# Altium footprint library Basal.PcbLib: 248 footprints (part 5 of 16)
Each footprint in its own frame and in the unit in brackets; x right, y up, seen from the top. Pads: shape width x height; smd on the part's side, far side on the other; paste and mask are expansions set on the pad; w line width, h text height; cw(c..) or ccw(c..) is an arc to the next point about the centre after c.
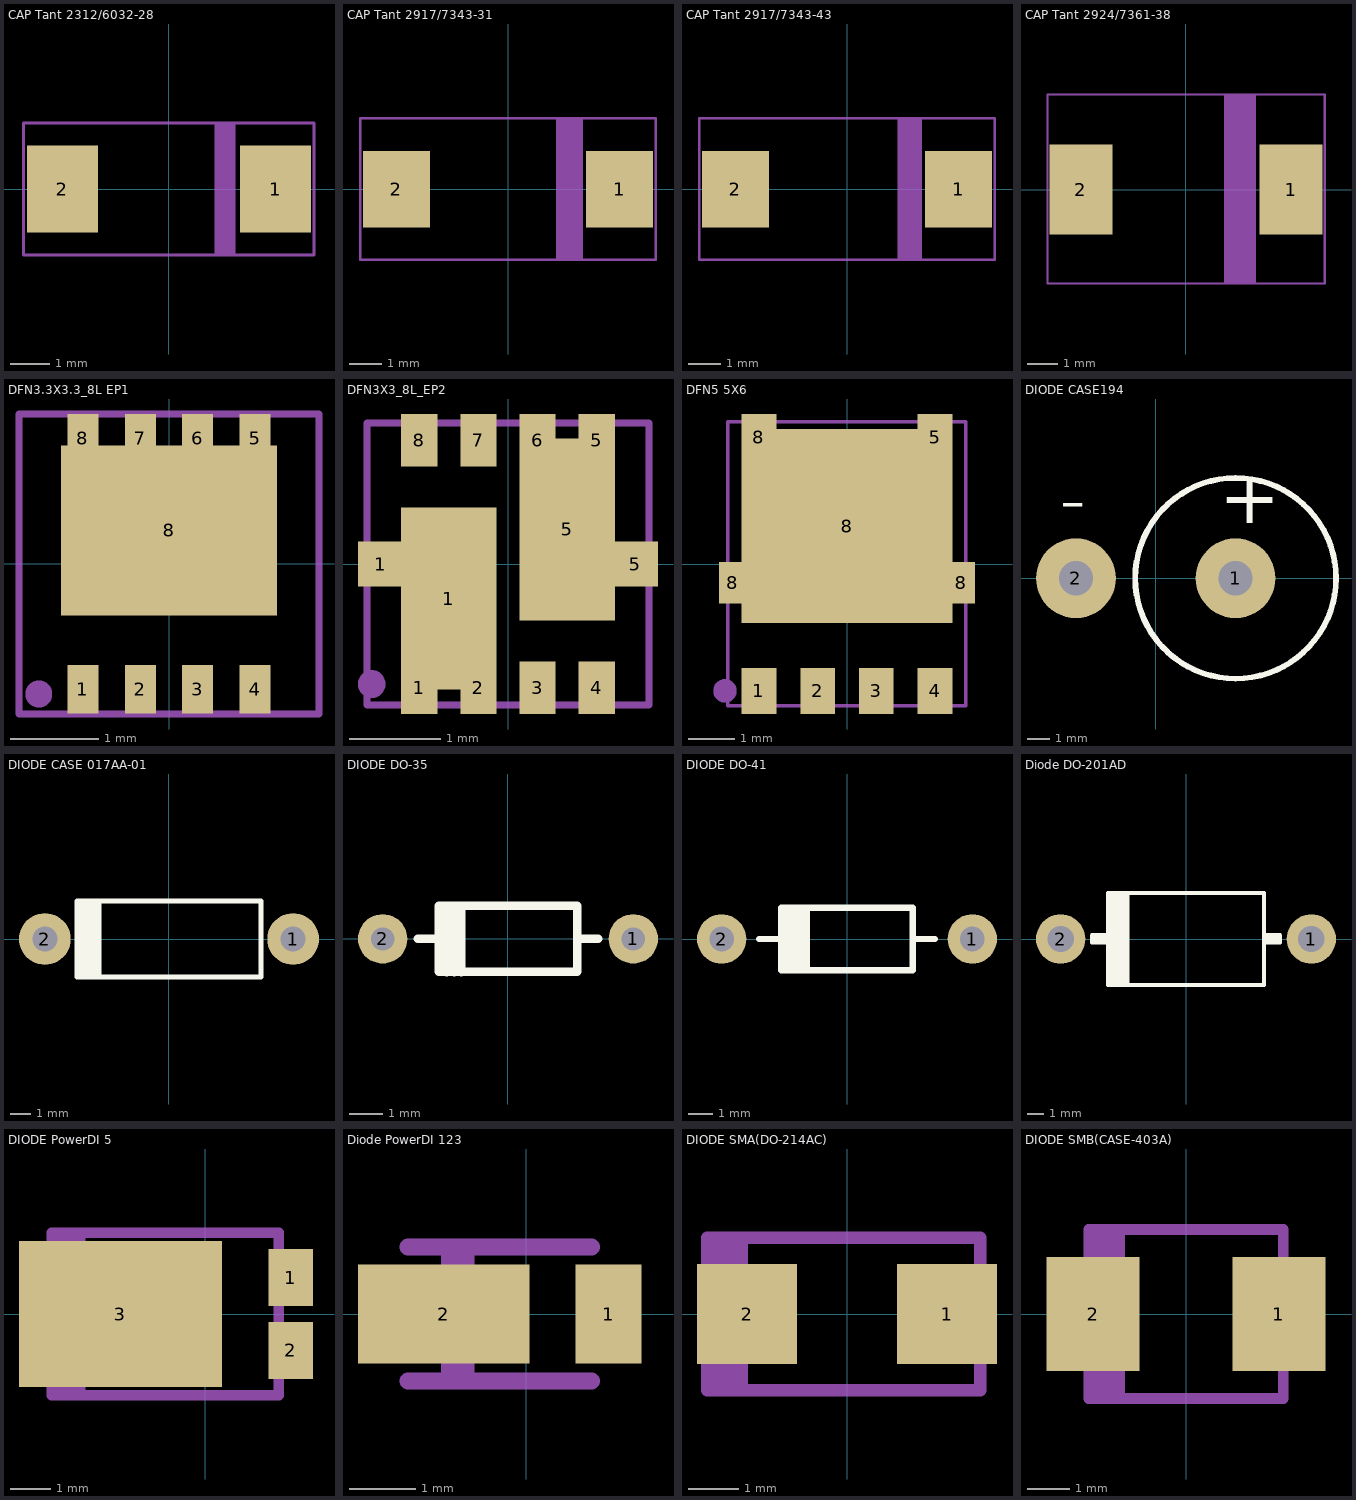
[diagram p4: the footprints below, top view; thin cyan lines are the x and y axes]

## CAP Tant 2312/6032-28 [mm] "钽电容C型封装"
height 28
pads (2):
  rect 1.8x2.2 smd: 1(2.7,0) 2(-2.7,0)
Mechanical 15:
  lines w0.076: 1.194,-1.672 1.194,1.68 ; 1.27,-1.672 1.27,1.68 ; 1.346,-1.672 1.346,1.68 ; 1.422,-1.672 1.422,1.68 ; 1.499,-1.672 1.499,1.68 ; 1.575,-1.672 1.575,1.68 ; 1.651,-1.672 1.651,1.68 ; -3.687,-1.672 -3.687,1.68 3.679,1.68 3.679,-1.672 -3.687,-1.672
3D body "AVX_C_CASE.STEP": height 2.7, standoff 0, extent -3.054,-1.671 3.046,1.679

## CAP Tant 2917/7343-31 [mm] "钽电容D型封装"
height 31
pads (2):
  rect 2.1x2.4 smd: 1(3.5,0) 2(-3.5,0)
Mechanical 15:
  lines w0.076: 1.549,-2.21 1.549,2.235 ; 1.626,-2.21 1.626,2.235 ; 1.702,-2.21 1.702,2.235 ; 1.778,-2.21 1.778,2.235 ; 1.854,-2.21 1.854,2.235 ; 1.93,-2.21 1.93,2.235 ; 2.007,-2.21 2.007,2.235 ; 2.083,-2.21 2.083,2.235 ; 2.159,-2.21 2.159,2.235 ; 2.235,-2.21 2.235,2.235 ; 2.311,-2.21 2.311,2.235 ; -4.623,-2.21 4.623,-2.21 4.623,2.235 -4.623,2.235 -4.623,-2.21
3D body "AVX_D_CASE.STEP": height 3.01, standoff 0, extent -3.708,-2.208 3.692,2.242

## CAP Tant 2917/7343-43 [mm] "钽电容E型封装"
height 43
pads (2):
  rect 2.1x2.4 smd: 1(3.5,0) 2(-3.5,0)
Mechanical 15:
  lines w0.076: 1.626,-2.21 1.626,2.235 ; 1.702,-2.21 1.702,2.235 ; 1.778,-2.21 1.778,2.235 ; 1.854,-2.21 1.854,2.235 ; 1.93,-2.21 1.93,2.235 ; 2.007,-2.21 2.007,2.235 ; 2.083,-2.21 2.083,2.235 ; 2.159,-2.21 2.159,2.235 ; 2.235,-2.21 2.235,2.235 ; 2.311,-2.21 2.311,2.235 ; -4.623,-2.21 4.623,-2.21 4.623,2.235 -4.623,2.235 -4.623,-2.21
3D body "AVX_E_CASE.STEP": height 4.2, standoff 0, extent -3.7,-2.204 3.7,2.246

## CAP Tant 2924/7361-38 [mm] "钽电容V型封装"
height 38
pads (2):
  rect 2.1x3 smd: 1(3.5,0) 2(-3.5,0)
Mechanical 15:
  lines w0.076: 1.299,-3.128 1.299,3.171 ; 1.376,-3.128 1.376,3.171 ; 1.452,-3.128 1.452,3.171 ; 1.528,-3.128 1.528,3.171 ; 1.604,-3.128 1.604,3.171 ; 1.68,-3.128 1.68,3.171 ; 1.757,-3.128 1.757,3.171 ; 1.833,-3.128 1.833,3.171 ; 1.909,-3.128 1.909,3.171 ; 1.985,-3.128 1.985,3.171 ; 2.061,-3.128 2.061,3.171 ; 2.138,-3.128 2.138,3.171 ; 2.214,-3.128 2.214,3.171 ; 2.29,-3.128 2.29,3.171 ; -4.619,-3.128 4.627,-3.128 4.627,3.171 -4.619,3.171 -4.619,-3.128
3D body "capcp7361x38.STEP": height 3.45, standoff 0, extent -3.746,-3.15 3.754,3.15

## DFN3.3X3.3_8L EP1 [mm]
pads (9):
  rect 0.35x0.55 smd: 1(-0.975,-1.422) 2(-0.325,-1.422) 3(0.325,-1.422) 4(0.975,-1.422) 5(0.975,1.423) 6(0.325,1.423) 7(-0.325,1.423) 8(-0.975,1.423)
  rect 2.45x1.93 smd: 8(0,0.378)
Mechanical 15:
  circle w0.152: c-1.476,-1.476 r0.076
  lines w0.076: -1.7,-1.703 -1.7,1.697 1.7,1.698 1.7,-1.702 -1.7,-1.702
3D body "DFN 3_3x3_3.STEP": height 0.75, standoff 0, extent -1.65,-1.665 1.65,1.655

## DFN3X3_8L_EP2 [mm]
pads (12):
  rect 0.5x0.5 smd: 1(-1.4,0) 5(1.4,0)
  rect 0.4x0.58 smd: 1(-0.975,-1.36) 2(-0.325,-1.36) 3(0.325,-1.36) 4(0.975,-1.36) 5(0.975,1.36) 6(0.325,1.36) 7(-0.325,1.36) 8(-0.975,1.36)
  rect 1.05x2 smd: 1(-0.65,-0.381) 5(0.65,0.381)
Mechanical 15:
  circle w0.152: c-1.499,-1.321 r0.076
  lines w0.076: -1.55,-1.55 -1.55,1.55 1.55,1.55 1.55,-1.55 -1.55,-1.55
3D body "DFN_3x3_8L_EP2_P.STEP": height 0.81, standoff 0, extent -1.55,-1.6 1.55,1.6

## DFN5 5X6 [mm]
pads (9):
  rect 0.75x1 smd: 1(-1.905,-2.747) 2(-0.635,-2.747) 3(0.635,-2.747) 4(1.905,-2.747) 5(1.905,2.747) 8(-1.905,2.747)
  rect 0.6x0.905 smd paste-2: 8(-2.474,-0.405) 8(2.474,-0.405)
  rect 4.56x4.2 smd paste+0: 8(0,0.819)
Mechanical 15:
  circle w0.254: c-2.642,-2.747 r0.127
  lines w0.076: -2.578,-3.07 -2.578,3.082 2.576,3.082 2.576,-3.07 -2.578,-3.07
3D body "DFN5x6_SO8FL.STEP": height 1.13, standoff 0, extent -2.575,-3.069 2.575,3.081

## DIODE CASE194 [mm]
pads (2):
  round 3.5 hole 1.5: 1(3.5,0) 2(-3.5,0)
Top Overlay:
  circle w0.254: c3.5,0 r4.4
  text "+" at 2.774,1.651 h4
  text "-" at -4.206,1.651 h4

## DIODE CASE 017AA-01 [mm] "400mil间距直插二极管封装"
pads (2):
  round 2.5 hole 1.2: 1(6,0) 2(-6,0)
Top Overlay:
  lines w0.254: -4.216,-1.84 -4.216,1.84 ; -4.013,-1.84 -4.013,1.84 ; -3.378,-1.84 -3.378,1.84 ; -4.45,-1.84 -4.45,1.84 4.45,1.84 4.45,-1.84 -4.45,-1.84 ; -3.785,-1.84 -3.785,1.84 -3.785,-1.84 ; -3.581,-1.84 -3.581,1.84 -3.581,-1.84
3D body "Diode Case 017AA.STEP": height 4.4, standoff -2, extent -6.5,-1.7 6.5,1.7

## DIODE DO-35 [mm] "400mil间距直插二极管封装"
pads (2):
  round 1.5 hole 0.7: 1(3.8,0) 2(-3.8,0)
Top Overlay:
  lines w0.254: -2.743,0 -2.108,0 ; -1.854,-1.009 -1.854,0.991 ; -1.626,-1.009 -1.626,0.991 ; -1.422,-1.009 -1.422,0.991 ; 2.108,0 2.743,0 ; -2.1,-1 -2.1,1 2.1,1 2.1,-1 -2.1,-1
3D body "Diode DO-35.STEP": height 2.16, standoff -2.25, extent -4.09,-0.96 4.09,0.96

## DIODE DO-41 [mm] "400mil间距直插二极管封装"
pads (2):
  round 2 hole 1: 1(5.08,0) 2(-5.08,0)
Top Overlay:
  lines w0.254: -3.556,0 -2.667,0 ; -2.413,-1.27 -2.413,1.27 ; -2.184,-1.27 -2.184,1.27 ; -1.778,-1.27 -1.778,1.27 ; -1.626,-1.27 -1.626,1.27 ; 2.667,0 3.556,0 ; -2.667,-1.27 2.667,-1.27 2.667,0.254 2.667,1.27 -2.667,1.27 -2.667,-1.27 ; -1.981,-1.27 -1.981,1.27 -1.981,-1.27
3D body "Diode DO-41-2.STEP": height 2.72, standoff -2.6, extent -5.512,-1.36 5.512,1.36

## Diode DO-201AD [mm] "500mil间距直插二极管封装"
pads (2):
  round 3 hole 1.6: 1(7.62,0) 2(-7.62,0)
Top Overlay:
  region: -3.45,2.8 -4.75,2.8 -4.75,-2.8 -3.45,-2.8
  lines w0.254: -5.715,0 -4.75,0 ; -4.75,-0.203 -5.715,-0.203 -5.715,0.229 -4.75,0.229 ; 4.75,-0.203 5.715,-0.203 5.715,0.229 4.75,0.229 ; 4.75,0 5.715,0 ; -4.75,-2.8 4.75,-2.8 4.75,2.8 -4.75,2.8 -4.75,-2.8
3D body "DO-201AD.STEP": height 7.6, standoff -4, extent -8.28,-2.8 8.28,2.8

## DIODE PowerDI 5 [mm]
pads (3):
  rect 1.1x1.4 smd: 1(2.099,0.9) 2(2.099,-0.9)
  rect 5x3.6 smd: 3(-2.099,0)
Mechanical 15:
  lines w0.254: -3.556,-2 -3.556,2 ; -3.321,-2 -3.321,2 ; -3.086,-2 -3.086,2 ; -3.791,-2 -3.791,2 1.809,2 1.809,-2 -3.791,-2
3D body: height 1.2, standoff 0, extent -3.791,-2 1.809,2
3D body: height 1.21, standoff 0, extent -3.238,-1.984 -2.858,1.984

## Diode PowerDI 123 [mm] "贴片二极管SOD-123封装"
pads (2):
  rect 1x1.5 smd: 1(1.251,0)
  rect 2.6x1.5 smd: 2(-1.251,0)
Mechanical 15:
  lines w0.254: -1.797,-1.016 0.997,-1.016 ; -1.797,1.016 0.997,1.016 ; -1.162,-1.016 -1.162,1.016 ; -0.908,-1.016 -0.908,1.016
3D body: height 1.2, standoff 0, extent -1.911,-0.953 1.111,0.953
3D body: height 1.21, standoff 0, extent -1.162,-0.953 -0.908,0.953

## DIODE SMA(DO-214AC) [mm] "SS(1~3)4系列贴片二极管"
pads (2):
  rect 2x2 smd: 1(2,0) 2(-2,0)
Mechanical 15:
  lines w0.254: -2.565,-1.524 -2.565,1.524 ; -2.337,-1.524 -2.337,1.524 ; -2.108,-1.524 -2.108,1.524 ; -2.794,-1.524 2.667,-1.524 2.667,1.524 -2.794,1.524 -2.794,-1.524
3D body "SMA-DIDOE.STEP": height 2.7, standoff 0, extent -2.825,-1.5 2.775,1.45

## DIODE SMB(CASE-403A) [mm]
pads (2):
  rect 2.2x2.7 smd: 1(2.2,0) 2(-2.2,0)
Mechanical 15:
  lines w0.254: -2.057,-2 -2.057,2 ; -1.815,-2 -1.815,2 ; -1.572,-2 -1.572,2 ; -2.3,-2 2.3,-2 2.3,2 -2.3,2 -2.3,-2
3D body "DO-214AA(SMB).STEP": height 2.45, standoff 0.03, extent -2.75,-1.95 2.75,1.95